# Altium footprint library IC.Pcblib: 91 footprints (part 3 of 6)
Each footprint in its own frame and in the unit in brackets; x right, y up, seen from the top. Pads: shape width x height; smd on the part's side, far side on the other; paste and mask are expansions set on the pad; w line width, h text height; cw(c..) or ccw(c..) is an arc to the next point about the centre after c.
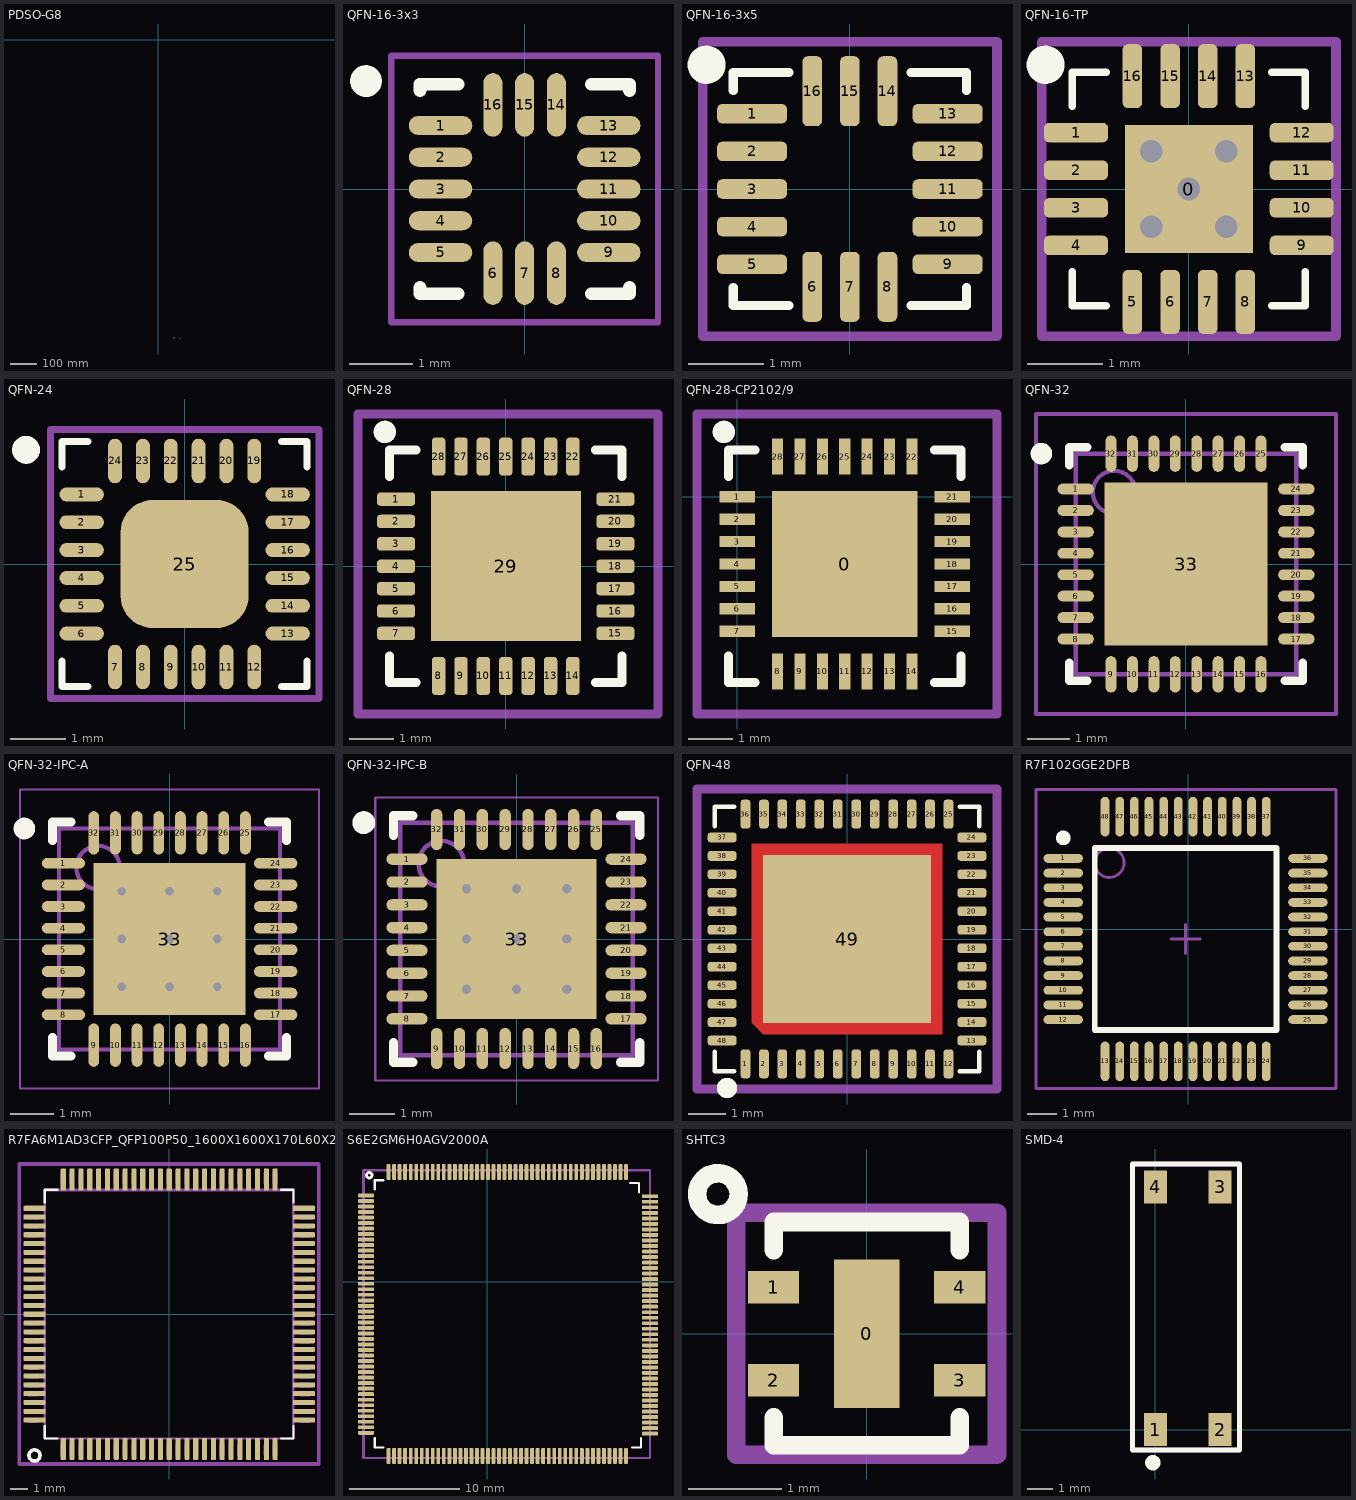
[diagram p2: the footprints below, top view; thin cyan lines are the x and y axes]

## PDSO-G8 [mm]
pads (11):
  round 1.524 hole 0.762: 1(59.2,-1117.9) 2(60.9,-1117.8)
  rect 0.5x2.2 smd: 3(0.6,1.55)
  rect 0.6x1.55 smd: 4(68.2,-1121.4) 4(68.2,-1118) 4(69.6,-1121.4) 4(69.6,-1118) 4(70.9,-1121.4) 4(70.9,-1118) 4(72.3,-1121.4) 4(72.3,-1118)
Top Layer:
  rectangle: 76.3,-1121.6 81.9,-1118.8
Mechanical 15:
  rectangle: -2.5,2.1 -2.3,2.4

## QFN-16-3x3 [mm] "QFN, 16-Leads, Body 3.00x3.00mm, Pitch 0.50mm, IPC Medium Density"
height 0.9
pads (16):
  oval 1x0.3 smd: 1(-1.325,1) 2(-1.325,0.5) 3(-1.325,0) 4(-1.325,-0.5) 5(-1.325,-1) 9(1.325,-1) 10(1.325,-0.5) 11(1.325,0) 12(1.325,0.5) 13(1.325,1)
  oval 0.3x1 smd: 6(-0.5,-1.325) 7(0,-1.325) 8(0.5,-1.325) 14(0.5,1.325) 15(0,1.325) 16(-0.5,1.325)
Top Overlay:
  circle w0.25: c-2.5,1.7 r0.125
  lines w0.2: -1.65,-1.55 -1.65,-1.65 -1.05,-1.65 ; -1.65,1.55 -1.65,1.65 -1.05,1.65 ; 1.05,-1.65 1.65,-1.65 1.65,-1.55 ; 1.05,1.65 1.65,1.65 1.65,1.55
Mechanical 13:
  lines w0.1: -2.1,-2.1 2.1,-2.1 2.1,2.1 -2.1,2.1 -2.1,-2.1
  text ".Designator" at -0.9,-0.2 h0.8
3D body "QFN50P300X300X90-16N.step": height 0.9, standoff 0, extent -1.55,-1.5 1.55,1.6

## QFN-16-3x5 [mm] "Quad Flat No-Lead (QFN), 0.50 mm pitch; square, 3 pin X 5 pin, 3.00 mm L X 3.00 mm W X 1.00 mm H body"
height 1
pads (16):
  rrect54% 0.93x0.26 smd: 1(-1.3,1) 2(-1.3,0.5) 3(-1.3,0) 4(-1.3,-0.5) 5(-1.3,-1) 9(1.3,-1) 10(1.3,-0.5) 11(1.3,0) 12(1.3,0.5) 13(1.3,1)
  rrect54% 0.26x0.93 smd: 6(-0.5,-1.3) 7(0,-1.3) 8(0.5,-1.3) 14(0.5,1.3) 15(0,1.3) 16(-0.5,1.3)
Top Overlay:
  circle w0.254: c-1.905,1.651 r0.127
  lines w0.12: -1.55,-1.31 -1.55,-1.55 -0.81,-1.55 ; -1.55,1.31 -1.55,1.55 -0.81,1.55 ; 0.81,-1.55 1.55,-1.55 1.55,-1.31 ; 0.81,1.55 1.55,1.55 1.55,1.31
Mechanical 13:
  lines w0.12: -1.956,-1.956 1.956,-1.956 1.956,1.956 -1.956,1.956 -1.956,-1.956
  text ".Designator" at -1.854,-0.229 h1
Mechanical 15:
  lines w0.127: -1.956,-1.956 -1.956,1.956 1.956,1.956 1.956,-1.956 -1.956,-1.956
  text ".Comment" at -1.854,-0.229 h1
3D body "QFN16P50_300X300X100L56X24.STEP": height 1, standoff 0, extent -1.55,-1.55 1.55,1.55

## QFN-16-TP [mm]
pads (17):
  rect 1.7x1.7 smd: 0(0,0)
  rrect54% 0.85x0.26 smd: 1(-1.5,0.75) 2(-1.5,0.25) 3(-1.5,-0.25) 4(-1.5,-0.75) 9(1.5,-0.75) 10(1.5,-0.25) 11(1.5,0.25) 12(1.5,0.75)
  rrect54% 0.26x0.85 smd: 5(-0.75,-1.5) 6(-0.25,-1.5) 7(0.25,-1.5) 8(0.75,-1.5) 13(0.75,1.5) 14(0.25,1.5) 15(-0.25,1.5) 16(-0.75,1.5)
via -0.5,0.5 diameter 0.6 hole 0.3
via -0.5,-0.5 diameter 0.6 hole 0.3
via 0.5,-0.5 diameter 0.6 hole 0.3
via 0.5,0.5 diameter 0.6 hole 0.3
via 0,0 diameter 0.6 hole 0.3
Top Overlay:
  circle w0.254: c-1.905,1.651 r0.127
  lines w0.1: -1.55,-1.1 -1.55,-1.55 -1.31,-1.55 -1.1,-1.55 ; -1.55,1.1 -1.55,1.31 -1.55,1.55 -1.1,1.55 ; 1.1,-1.55 1.55,-1.55 1.55,-1.31 1.55,-1.1 ; 1.1,1.55 1.31,1.55 1.55,1.55 1.55,1.1
Mechanical 13:
  lines w0.12: -1.956,-1.956 -1.956,1.956 1.956,1.956 1.956,-1.956 -1.956,-1.956
  text ".Designator" at -1.854,-0.229 h1
Mechanical 15:
  lines w0.127: -1.956,-1.956 1.956,-1.956 1.956,1.956 -1.956,1.956 -1.956,-1.956
  text ".Comment" at -1.854,-0.229 h1
3D body "ALSRobot-QFN16 3x3.STEP": height 0.9, standoff 0, extent -1.549,-1.521 1.493,1.521

## QFN-24 [mm]
height 1
pads (25):
  oval 0.8x0.25 smd: 1(-1.85,1.25) 2(-1.85,0.75) 3(-1.85,0.25) 4(-1.85,-0.25) 5(-1.85,-0.75) 6(-1.85,-1.25) 13(1.85,-1.25) 14(1.85,-0.75) 15(1.85,-0.25) 16(1.85,0.25) 17(1.85,0.75) 18(1.85,1.25)
  oval 0.25x0.8 smd: 7(-1.25,-1.85) 8(-0.75,-1.85) 9(-0.25,-1.85) 10(0.25,-1.85) 11(0.75,-1.85) 12(1.25,-1.85) 19(1.25,1.85) 20(0.75,1.85) 21(0.25,1.85) 22(-0.25,1.85) 23(-0.75,1.85) 24(-1.25,1.85)
  rrect50% 2.3x2.3 smd: 25(0,0)
Top Overlay:
  circle w0.25: c-2.85,2.05 r0.125
  lines w0.127: -2.2,-1.739 -2.2,-2.2 -1.738,-2.2 ; -2.2,1.738 -2.2,2.2 -1.738,2.2 ; 1.739,-2.2 2.2,-2.2 2.2,-1.739 ; 1.739,2.2 2.2,2.2 2.2,1.738
Mechanical 13:
  lines w0.127: -2.413,-2.413 2.413,-2.413 2.413,2.413 -2.413,2.413 -2.413,-2.413
  text ".Designator" at -2.2,-0.2 h1
Mechanical 15:
  lines w0.127: -2.413,-2.413 2.413,-2.413 2.413,2.413 -2.413,2.413 -2.413,-2.413
  text ".Comment" at -2.1,-0.2 h1
3D body: height 1, standoff 0, extent -2.05,-2.05 2.05,2.05

## QFN-28 [mm] "QFN, 28-Leads, Body 5.75x5.75mm, Pitch 0.65mm, Thermal Pad 3.70x3.70mm, IPC Medium Density"
height 0.8
pads (29):
  rrect50% 0.85x0.3 smd: 1(-2.45,1.5) 2(-2.45,1) 3(-2.45,0.5) 4(-2.45,0) 5(-2.45,-0.5) 6(-2.45,-1) 7(-2.45,-1.5) 15(2.45,-1.5) 16(2.45,-1) 17(2.45,-0.5) 18(2.45,0) 19(2.45,0.5) 20(2.45,1) 21(2.45,1.5)
  rrect50% 0.3x0.85 smd: 8(-1.5,-2.45) 9(-1,-2.45) 10(-0.5,-2.45) 11(0,-2.45) 12(0.5,-2.45) 13(1,-2.45) 14(1.5,-2.45) 22(1.5,2.45) 23(1,2.45) 24(0.5,2.45) 25(0,2.45) 26(-0.5,2.45) 27(-1,2.45) 28(-1.5,2.45)
  rect 3.35x3.35 smd: 29(0,0)
Top Overlay:
  circle w0.25: c-2.7,3 r0.125
  lines w0.2: -2.6,-2 -2.6,-2.6 -2,-2.6 ; -2.6,2 -2.6,2.6 -2,2.6 ; 2,-2.6 2.6,-2.6 2.6,-2 ; 2,2.6 2.6,2.6 2.6,2
Mechanical 13:
  lines w0.2: -3.3,-3.3 -3.3,3.4 3.4,3.4 3.4,-3.3 -3.3,-3.3
  text ".Designator" at -3,-0.4 h1.5
Mechanical 15:
  lines w0.2: -3.3,-3.3 3.4,-3.3 3.4,3.4 -3.3,3.4 -3.3,-3.3
  text ".Comment" at -3,-0.4 h1.5
3D body "User Library-QFN28_050.step": height 0.85, standoff 0, extent -2.505,-2.505 2.505,2.505

## QFN-28-CP2102/9 [mm]
height 1
pads (29):
  rect 3.25x3.25 smd: 0(2.4,-1.5)
  rect 0.8x0.25 smd: 1(0,0) 2(0,-0.5) 3(0,-1) 4(0,-1.5) 5(0,-2) 6(0,-2.5) 7(0,-3) 15(4.8,-3) 16(4.8,-2.5) 17(4.8,-2) 18(4.8,-1.5) 19(4.8,-1) 20(4.8,-0.5) 21(4.8,0)
  rect 0.25x0.8 smd: 8(0.9,-3.9) 9(1.4,-3.9) 10(1.9,-3.9) 11(2.4,-3.9) 12(2.9,-3.9) 13(3.4,-3.9) 14(3.9,-3.9) 22(3.9,0.9) 23(3.4,0.9) 24(2.9,0.9) 25(2.4,0.9) 26(1.9,0.9) 27(1.4,0.9) 28(0.9,0.9)
Top Overlay:
  circle w0.25: c-0.3,1.45 r0.125
  lines w0.2: -0.2,-3.55 -0.2,-4.15 0.4,-4.15 ; -0.2,0.45 -0.2,1.05 0.4,1.05 ; 4.4,-4.15 5,-4.15 5,-3.55 ; 4.4,1.05 5,1.05 5,0.45
Mechanical 13:
  lines w0.2: -0.9,-4.85 5.8,-4.85 5.8,1.85 -0.9,1.85 -0.9,-4.85
  text ".Designator" at -0.05,-1.15 h1
Mechanical 15:
  lines w0.2: -0.9,-4.85 -0.9,1.85 5.8,1.85 5.8,-4.85 -0.9,-4.85
  text ".Comment" at 0.05,-1.15 h1
3D body "User Library-QFN28_050.step": height 0.85, standoff 0, extent -0.105,-4.005 4.905,1.005

## QFN-32 [mm] "QFN, 32-Leads, Body 5x5 mm, Pitch 0.5mm, IPC High Density"
height 1
pads (33):
  oval 0.85x0.254 smd: 1(-2.575,1.75) 2(-2.575,1.25) 3(-2.575,0.75) 4(-2.575,0.25) 5(-2.575,-0.25) 6(-2.575,-0.75) 7(-2.575,-1.25) 8(-2.575,-1.75) 17(2.575,-1.75) 18(2.575,-1.25) 19(2.575,-0.75) 20(2.575,-0.25) 21(2.575,0.25) 22(2.575,0.75) 23(2.575,1.25) 24(2.575,1.75)
  oval 0.254x0.85 smd: 9(-1.75,-2.575) 10(-1.25,-2.575) 11(-0.75,-2.575) 12(-0.25,-2.575) 13(0.25,-2.575) 14(0.75,-2.575) 15(1.25,-2.575) 16(1.75,-2.575) 25(1.75,2.575) 26(1.25,2.575) 27(0.75,2.575) 28(0.25,2.575) 29(-0.25,2.575) 30(-0.75,2.575) 31(-1.25,2.575) 32(-1.75,2.575)
  rect 3.8x3.8 smd: 33(0,0)
Top Overlay:
  circle w0.25: c-3.375,2.575 r0.125
  lines w0.2: -2.725,-2.3 -2.725,-2.725 -2.3,-2.725 ; -2.725,2.3 -2.725,2.725 -2.3,2.725 ; 2.3,-2.725 2.725,-2.725 2.725,-2.3 ; 2.3,2.725 2.725,2.725 2.725,2.3
Mechanical 13:
  circle w0.1: c-1.675,1.675 r0.5
  lines w0.1: -2.575,-2.575 2.575,-2.575 2.575,2.575 -2.575,2.575 -2.575,-2.575
Mechanical 15:
  lines w0.1: -0.5,0 0.5,0 ; 0,-0.5 0,0.5 ; -3.5,-3.5 3.5,-3.5 3.5,3.5 -3.5,3.5 -3.5,-3.5
3D body "User Library-QFN32-1.STEP": height 0.9, standoff -0.03, extent -2.5,-2.5 2.5,2.5

## QFN-32-IPC-A [mm]
height 0.5
pads (33):
  oval 1x0.25 smd: 1(-2.45,1.75) 2(-2.45,1.25) 3(-2.45,0.75) 4(-2.45,0.25) 5(-2.45,-0.25) 6(-2.45,-0.75) 7(-2.45,-1.25) 8(-2.45,-1.75) 17(2.45,-1.75) 18(2.45,-1.25) 19(2.45,-0.75) 20(2.45,-0.25) 21(2.45,0.25) 22(2.45,0.75) 23(2.45,1.25) 24(2.45,1.75)
  oval 0.25x1 smd: 9(-1.75,-2.45) 10(-1.25,-2.45) 11(-0.75,-2.45) 12(-0.25,-2.45) 13(0.25,-2.45) 14(0.75,-2.45) 15(1.25,-2.45) 16(1.75,-2.45) 25(1.75,2.45) 26(1.25,2.45) 27(0.75,2.45) 28(0.25,2.45) 29(-0.25,2.45) 30(-0.75,2.45) 31(-1.25,2.45) 32(-1.75,2.45)
  rect 3.5x3.5 smd: 33(0,0)
via -1.1,1.1 diameter 0.5 hole 0.2
via 0,1.1 diameter 0.5 hole 0.2
via 1.1,1.1 diameter 0.5 hole 0.2
via -1.1,0 diameter 0.5 hole 0.2
via 0,0 diameter 0.5 hole 0.2
via 1.1,0 diameter 0.5 hole 0.2
via -1.1,-1.1 diameter 0.5 hole 0.2
via 0,-1.1 diameter 0.5 hole 0.2
via 1.1,-1.1 diameter 0.5 hole 0.2
Top Overlay:
  circle w0.25: c-3.35,2.55 r0.125
  lines w0.2: -2.7,-2.275 -2.7,-2.7 -2.275,-2.7 ; -2.7,2.275 -2.7,2.7 -2.275,2.7 ; 2.275,-2.7 2.7,-2.7 2.7,-2.275 ; 2.275,2.7 2.7,2.7 2.7,2.275
Mechanical 13:
  circle w0.1: c-1.65,1.65 r0.5
  lines w0.1: -2.55,-2.55 -2.55,2.55 2.55,2.55 2.55,-2.55 -2.55,-2.55
Mechanical 15:
  lines w0.05: -3.45,-3.45 -3.45,3.45 3.45,3.45 3.45,-3.45 -3.45,-3.45
  lines w0.1: -0.5,0 0.5,0 ; 0,-0.5 0,0.5
3D body "QFN-32-IPC-A.step": height 0.5, standoff 0, extent -2.57,-2.57 2.57,2.57

## QFN-32-IPC-B [mm] "QFN, 32-Leads, Body 5.00x5.00mm, Pitch 0.50mm, Thermal Pad 3.50x3.50mm, IPC Medium Density"
height 0.5
pads (33):
  oval 0.9x0.25 smd: 1(-2.4,1.75) 2(-2.4,1.25) 3(-2.4,0.75) 4(-2.4,0.25) 5(-2.4,-0.25) 6(-2.4,-0.75) 7(-2.4,-1.25) 8(-2.4,-1.75) 17(2.4,-1.75) 18(2.4,-1.25) 19(2.4,-0.75) 20(2.4,-0.25) 21(2.4,0.25) 22(2.4,0.75) 23(2.4,1.25) 24(2.4,1.75)
  oval 0.25x0.9 smd: 9(-1.75,-2.4) 10(-1.25,-2.4) 11(-0.75,-2.4) 12(-0.25,-2.4) 13(0.25,-2.4) 14(0.75,-2.4) 15(1.25,-2.4) 16(1.75,-2.4) 25(1.75,2.4) 26(1.25,2.4) 27(0.75,2.4) 28(0.25,2.4) 29(-0.25,2.4) 30(-0.75,2.4) 31(-1.25,2.4) 32(-1.75,2.4)
  rect 3.5x3.5 smd: 33(0,0)
via -1.1,1.1 diameter 0.5 hole 0.2
via 0,1.1 diameter 0.5 hole 0.2
via 1.1,1.1 diameter 0.5 hole 0.2
via -1.1,0 diameter 0.5 hole 0.2
via 0,0 diameter 0.5 hole 0.2
via 1.1,0 diameter 0.5 hole 0.2
via -1.1,-1.1 diameter 0.5 hole 0.2
via 0,-1.1 diameter 0.5 hole 0.2
via 1.1,-1.1 diameter 0.5 hole 0.2
Top Overlay:
  circle w0.25: c-3.35,2.55 r0.125
  lines w0.2: -2.7,-2.275 -2.7,-2.7 -2.275,-2.7 ; -2.7,2.275 -2.7,2.7 -2.275,2.7 ; 2.275,-2.7 2.7,-2.7 2.7,-2.275 ; 2.275,2.7 2.7,2.7 2.7,2.275
Mechanical 13:
  circle w0.1: c-1.65,1.65 r0.5
  lines w0.1: -2.55,-2.55 -2.55,2.55 2.55,2.55 2.55,-2.55 -2.55,-2.55
Mechanical 15:
  lines w0.05: -3.1,-3.1 -3.1,3.1 3.1,3.1 3.1,-3.1 -3.1,-3.1
  lines w0.1: -0.5,0 0.5,0 ; 0,-0.5 0,0.5
3D body "QFN-32-IPC.step": height 0.5, standoff 0, extent -2.57,-2.57 2.57,2.57

## QFN-48 [mm] "Quad Flat No-Lead (QFN with Tab), 0.50 mm pitch; square, 12 pin X 12 pin, 7.00 mm L X 7.00 mm W X 1.00 mm H body"
height 1
pads (49):
  rrect54% 0.26x0.78 smd: 1(-2.75,-3.385) 2(-2.25,-3.385) 3(-1.75,-3.385) 4(-1.25,-3.385) 5(-0.75,-3.385) 6(-0.25,-3.385) 7(0.25,-3.385) 8(0.75,-3.385) 9(1.25,-3.385) 10(1.75,-3.385) 11(2.25,-3.385) 12(2.75,-3.385) 25(2.75,3.385) 26(2.25,3.385) 27(1.75,3.385) 28(1.25,3.385) 29(0.75,3.385) 30(0.25,3.385) 31(-0.25,3.385) 32(-0.75,3.385) 33(-1.25,3.385) 34(-1.75,3.385) 35(-2.25,3.385) 36(-2.75,3.385)
  rrect54% 0.78x0.26 smd: 13(3.385,-2.75) 14(3.385,-2.25) 15(3.385,-1.75) 16(3.385,-1.25) 17(3.385,-0.75) 18(3.385,-0.25) 19(3.385,0.25) 20(3.385,0.75) 21(3.385,1.25) 22(3.385,1.75) 23(3.385,2.25) 24(3.385,2.75) 37(-3.385,2.75) 38(-3.385,2.25) 39(-3.385,1.75) 40(-3.385,1.25) 41(-3.385,0.75) 42(-3.385,0.25) 43(-3.385,-0.25) 44(-3.385,-0.75) 45(-3.385,-1.25) 46(-3.385,-1.75) 47(-3.385,-2.25) 48(-3.385,-2.75)
  rect 4.55x4.55 smd paste-4.55 mask-4.55: 49(0,0)
Top Layer:
  region: 2.575,-2.575 -2.275,-2.575 -2.575,-2.275 -2.575,2.575 2.575,2.575
Top Overlay:
  circle w0.5: c-3.251,-4.039 r0.025
  lines w0.12: -3.58,-3.06 -3.58,-3.58 -3.06,-3.58 ; -3.58,3.06 -3.58,3.58 -3.06,3.58 ; 3.06,-3.58 3.58,-3.58 3.58,-3.06 ; 3.06,3.58 3.58,3.58 3.58,3.06
Top Paste:
  region: 2.195,-2.195 0.375,-2.195 0.375,-0.375 2.195,-0.375
  region: 2.195,0.375 0.375,0.375 0.375,2.195 2.195,2.195
  region: -0.375,-2.195 -2.195,-2.195 -2.195,-0.375 -0.375,-0.375
  region: -0.375,0.375 -2.195,0.375 -2.195,2.195 -0.375,2.195
Top Solder:
  region: 2.575,-2.575 -2.275,-2.575 -2.575,-2.275 -2.575,2.575 2.575,2.575
Mechanical 13:
  lines w0.254: -4.064,-4.064 -4.064,4.064 4.064,4.064 4.064,-4.064 -4.064,-4.064
  text ".Designator" at -3.353,-0.533 h2
Mechanical 15:
  lines w0.254: -4.064,-4.064 -4.064,4.064 -3.632,4.064 4.064,4.064 4.064,-4.064 -4.064,-4.064
  text ".Comment" at -3.556,-0.533 h2
3D body "QFN49P50_700X700X100L40X24T515.STEP": height 1, standoff 0, extent -3.55,-3.55 3.55,3.55

## R7F102GGE2DFB [mm]
pads (48):
  oval 1.35x0.3 smd: 1(-4.257,2.416) 2(-4.257,1.916) 3(-4.257,1.416) 4(-4.257,0.916) 5(-4.257,0.416) 6(-4.257,-0.084) 7(-4.257,-0.584) 8(-4.257,-1.084) 9(-4.257,-1.584) 10(-4.257,-2.084) 11(-4.257,-2.584) 12(-4.257,-3.084) 25(4.093,-3.084) 26(4.093,-2.584) 27(4.093,-2.084) 28(4.093,-1.584) 29(4.093,-1.084) 30(4.093,-0.584) 31(4.093,-0.084) 32(4.093,0.416) 33(4.093,0.916) 34(4.093,1.416) 35(4.093,1.916) 36(4.093,2.416)
  oval 0.3x1.35 smd: 13(-2.832,-4.509) 14(-2.332,-4.509) 15(-1.832,-4.509) 16(-1.332,-4.509) 17(-0.832,-4.509) 18(-0.332,-4.509) 19(0.168,-4.509) 20(0.668,-4.509) 21(1.168,-4.509) 22(1.668,-4.509) 23(2.168,-4.509) 24(2.668,-4.509) 37(2.668,3.841) 38(2.168,3.841) 39(1.668,3.841) 40(1.168,3.841) 41(0.668,3.841) 42(0.168,3.841) 43(-0.332,3.841) 44(-0.832,3.841) 45(-1.332,3.841) 46(-1.832,3.841) 47(-2.332,3.841) 48(-2.832,3.841)
Top Overlay:
  circle w0.25: c-4.257,3.116 r0.125
  lines w0.2: -3.182,-3.434 -3.182,2.766 3.018,2.766 3.018,-3.434 -3.182,-3.434
Mechanical 13:
  circle w0.1: c-2.682,2.266 r0.5
  lines w0.1: -5.187,-5.439 -5.187,4.771 5.049,4.771 5.049,-5.439 -5.187,-5.439
  text ".Designator" at -2.114,-0.588 h1
Mechanical 15:
  lines w0.05: -5.182,-5.434 -5.182,4.766 5.018,4.766 5.018,-5.434 -5.182,-5.434
  lines w0.1: -0.582,-0.334 0.418,-0.334 ; -0.082,-0.834 -0.082,0.166
  text ".Comment" at -1.987,-0.588 h1
3D body "TSQFP50P890X890X160-48N.step": height 1.6, standoff 0, extent -4.532,-4.784 4.368,4.116

## R7FA6M1AD3CFP_QFP100P50_1600X1600X170L60X21NN [mm] "Quad Flat Pack (QFP), 0.50 mm pitch; square, 25 pin X 25 pin, 14.00 mm L X 14.00 mm W X 1.70 mm H body"
height 1.7
pads (100):
  rrect48% 0.29x1.26 smd: 1(-6,-7.63) 2(-5.5,-7.63) 3(-5,-7.63) 4(-4.5,-7.63) 5(-4,-7.63) 6(-3.5,-7.63) 7(-3,-7.63) 8(-2.5,-7.63) 9(-2,-7.63) 10(-1.5,-7.63) 11(-1,-7.63) 12(-0.5,-7.63) 13(0,-7.63) 14(0.5,-7.63) 15(1,-7.63) 16(1.5,-7.63) 17(2,-7.63) 18(2.5,-7.63) 19(3,-7.63) 20(3.5,-7.63) 21(4,-7.63) 22(4.5,-7.63) 23(5,-7.63) 24(5.5,-7.63) 25(6,-7.63) 51(6,7.63) 52(5.5,7.63) 53(5,7.63) 54(4.5,7.63) 55(4,7.63) 56(3.5,7.63) 57(3,7.63) 58(2.5,7.63) 59(2,7.63) 60(1.5,7.63) 61(1,7.63) 62(0.5,7.63) 63(0,7.63) 64(-0.5,7.63) 65(-1,7.63) 66(-1.5,7.63) 67(-2,7.63) 68(-2.5,7.63) 69(-3,7.63) 70(-3.5,7.63) 71(-4,7.63) 72(-4.5,7.63) 73(-5,7.63) 74(-5.5,7.63) 75(-6,7.63)
  rrect48% 1.26x0.29 smd: 26(7.63,-6) 27(7.63,-5.5) 28(7.63,-5) 29(7.63,-4.5) 30(7.63,-4) 31(7.63,-3.5) 32(7.63,-3) 33(7.63,-2.5) 34(7.63,-2) 35(7.63,-1.5) 36(7.63,-1) 37(7.63,-0.5) 38(7.63,0) 39(7.63,0.5) 40(7.63,1) 41(7.63,1.5) 42(7.63,2) 43(7.63,2.5) 44(7.63,3) 45(7.63,3.5) 46(7.63,4) 47(7.63,4.5) 48(7.63,5) 49(7.63,5.5) 50(7.63,6) 76(-7.63,6) 77(-7.63,5.5) 78(-7.63,5) 79(-7.63,4.5) 80(-7.63,4) 81(-7.63,3.5) 82(-7.63,3) 83(-7.63,2.5) 84(-7.63,2) 85(-7.63,1.5) 86(-7.63,1) 87(-7.63,0.5) 88(-7.63,0) 89(-7.63,-0.5) 90(-7.63,-1) 91(-7.63,-1.5) 92(-7.63,-2) 93(-7.63,-2.5) 94(-7.63,-3) 95(-7.63,-3.5) 96(-7.63,-4) 97(-7.63,-4.5) 98(-7.63,-5) 99(-7.63,-5.5) 100(-7.63,-6)
Top Overlay:
  circle w0.2: c-7.63,-8 r0.314
  lines w0.12: -7.05,-6.33 -7.05,-7.05 -6.33,-7.05 ; -7.05,6.33 -7.05,7.05 -6.33,7.05 ; 6.33,-7.05 7.05,-7.05 7.05,-6.33 ; 6.33,7.05 7.05,7.05 7.05,6.33
Mechanical 11:
  lines w0.12: -7.05,-7.05 -7.05,7.05 7.05,7.05 7.05,-7.05 -7.05,-7.05
Mechanical 12:
  drawing of 404 lines, arcs and shapes, not listed
Mechanical 13:
  lines w0.2: -8.484,-8.484 8.458,-8.484 8.458,8.509 -8.484,8.509 -8.484,-8.484
  text ".Designator" at -4.739,-0.566 h2
3D body "R7FA6M1AD3CFP_QFP100P50_1600X1600X170L60X21N.STEP": height 1.7, standoff 0, extent -8,-8 8,8

## S6E2GM6H0AGV2000A [mm]
pads (176):
  rrect50% 1.45x0.35 smd: 1(-10.972,7.825) 2(-10.972,7.325) 3(-10.972,6.825) 4(-10.972,6.325) 5(-10.972,5.825) 6(-10.972,5.325) 7(-10.972,4.825) 8(-10.972,4.325) 9(-10.972,3.825) 10(-10.972,3.325) 11(-10.972,2.825) 12(-10.972,2.325) 13(-10.972,1.825) 14(-10.972,1.325) 15(-10.972,0.825) 16(-10.972,0.325) 17(-10.972,-0.175) 18(-10.972,-0.675) 19(-10.972,-1.175) 20(-10.972,-1.675) 21(-10.972,-2.175) 22(-10.972,-2.675) 23(-10.972,-3.175) 24(-10.972,-3.675) 25(-10.972,-4.175) 26(-10.972,-4.675) 27(-10.972,-5.175) 28(-10.972,-5.675) 29(-10.972,-6.175) 30(-10.972,-6.675) 31(-10.972,-7.175) 32(-10.972,-7.675) 33(-10.972,-8.175) 34(-10.972,-8.675) 35(-10.972,-9.175) 36(-10.972,-9.675) 37(-10.972,-13.675) 38(-10.972,-13.175) 39(-10.972,-12.675) 40(-10.972,-12.175) 41(-10.972,-11.675) 42(-10.972,-11.175) 43(-10.972,-10.675) 44(-10.972,-10.175) 89(14.75,-13.75) 90(14.75,-13.25) 91(14.75,-12.75) 92(14.75,-12.25) 93(14.75,-11.75) 94(14.75,-11.25) 95(14.75,-10.75) 96(14.75,-10.25) 97(14.75,-9.75) 98(14.75,-9.25) 99(14.75,-8.75) 100(14.75,-8.25) 101(14.75,-7.75) 102(14.75,-7.25) 103(14.75,-6.75) 104(14.75,-6.25) 105(14.75,-5.75) 106(14.75,-5.25) 107(14.75,-4.75) 108(14.75,-4.251) 109(14.75,-3.75) 110(14.75,-3.25) 111(14.75,-2.75) 112(14.75,-2.25) 113(14.75,-1.75) 114(14.75,-1.25) 115(14.75,-0.75) 116(14.75,-0.25) 117(14.75,0.25) 118(14.75,0.75) 119(14.75,1.25) 120(14.75,1.75) 121(14.75,2.25) 122(14.75,2.75) 123(14.75,3.25) 124(14.75,3.75) 125(14.75,4.25) 126(14.75,4.75) 127(14.75,5.25) 128(14.75,5.75) 129(14.75,6.25) 130(14.75,6.75) 131(14.75,7.25) 132(14.75,7.75)
  rrect50% 0.35x1.45 smd: 45(-8.925,-15.773) 46(-8.425,-15.773) 47(-7.925,-15.773) 48(-7.425,-15.773) 49(-6.925,-15.773) 50(-6.425,-15.773) 51(-5.925,-15.773) 52(-5.425,-15.773) 53(-4.925,-15.773) 54(-4.425,-15.773) 55(-3.925,-15.773) 56(-3.425,-15.773) 57(-2.925,-15.773) 58(-2.425,-15.773) 59(-1.925,-15.773) 60(-1.425,-15.773) 61(-0.925,-15.773) 62(-0.425,-15.773) 63(0.075,-15.773) 64(0.575,-15.773) 65(1.075,-15.773) 66(1.575,-15.773) 67(2.075,-15.773) 68(2.575,-15.773) 69(3.075,-15.773) 70(3.575,-15.773) 71(4.075,-15.773) 72(4.575,-15.773) 73(5.075,-15.773) 74(5.575,-15.773) 75(6.075,-15.773) 76(6.575,-15.773) 77(7.075,-15.773) 78(7.575,-15.773) 79(8.075,-15.773) 80(8.575,-15.773) 81(9.075,-15.773) 82(9.575,-15.773) 83(10.075,-15.773) 84(10.575,-15.773) 85(11.075,-15.773) 86(11.575,-15.773) 87(12.075,-15.773) 88(12.575,-15.773) 133(12.575,9.947) 134(12.075,9.947) 135(11.575,9.947) 136(11.075,9.947) 137(10.575,9.947) 138(10.075,9.947) 139(9.575,9.947) 140(9.075,9.947) 141(8.575,9.947) 142(8.075,9.947) 143(7.575,9.947) 144(7.075,9.947) 145(6.575,9.947) 146(6.075,9.947) 147(5.575,9.947) 148(5.075,9.947) 149(4.575,9.947) 150(4.075,9.947) 151(3.575,9.947) 152(3.075,9.947) 153(2.575,9.947) 154(2.075,9.947) 155(1.575,9.947) 156(1.075,9.947) 157(0.575,9.947) 158(0.075,9.947) 159(-0.425,9.947) 160(-0.925,9.947) 161(-1.425,9.947) 162(-1.925,9.947) 163(-2.425,9.947) 164(-2.925,9.947) 165(-3.425,9.947) 166(-3.925,9.947) 167(-4.425,9.947) 168(-4.925,9.947) 169(-5.425,9.947) 170(-5.925,9.947) 171(-6.425,9.947) 172(-6.925,9.947) 173(-7.425,9.947) 174(-7.925,9.947) 175(-8.425,9.947) 176(-8.925,9.947)
Top Overlay:
  circle w0.254: c-10.676,9.656 r0.25
  lines w0.2: -10.176,-14.144 -10.176,-14.994 -9.376,-14.994 ; -10.176,8.356 -10.176,9.206 -9.376,9.206 ; 12.949,8.956 13.749,8.956 13.749,8.106 ; 13.124,-14.994 13.924,-14.994 13.924,-14.144
Mechanical 13:
  lines w0.2: -11.227,-15.952 14.75,-15.952 14.75,10.106 -11.227,10.106 -11.227,-15.952
  text ".Designator" at -8.676,3.956 h1.5
Mechanical 15:
  lines w0.2: -11.151,-15.952 -11.151,10.106 14.75,10.106 14.75,-15.952 -11.151,-15.952
  text ".Comment" at -8.726,4.256 h1.5
3D body "User Library-LQFP144-1.STEP": height 1.6, standoff 0, extent -9,-13.75 13,8.25

## SHTC3 [mm]
pads (5):
  rect 0.7x1.6 smd: 0(0,0)
  rect 0.55x0.35 smd: 1(-1,0.5) 2(-1,-0.5) 3(1,-0.5) 4(1,0.5)
Top Overlay:
  circle w0.2: c-1.6,1.5 r0.224
  lines w0.2: -1,-0.9 -1,-1.2 1,-1.2 1,-0.9 ; -1,0.9 -1,1.2 1,1.2 1,0.9
Mechanical 13:
  lines w0.2: -1.4,-1.3 1.4,-1.3 1.4,1.3 -1.4,1.3 -1.4,-1.3
  text ".Designator" at -1.4,-0.2 h1
Mechanical 15:
  lines w0.2: -1.4,-1.3 -1.4,1.3 1.4,1.3 1.4,-1.3 -1.4,-1.3
  text ".Comment" at -1.4,-0.2 h1
3D body "HT_CD_SHTC3_STEP_File_V1_D1.STEP": height 0.75, standoff 0, extent -1,-1 1,1

## SMD-4 [mm]
pads (4):
  rect 0.9x1.3 smd: 1(0,0) 2(2.54,0) 3(2.54,9.5) 4(0,9.5)
Top Overlay:
  circle w0.5: c-0.1,-1.3 r0.05
  lines w0.2: -0.9,-0.8 -0.9,10.4 3.3,10.4 3.3,-0.8 -0.9,-0.8
Mechanical 13:
  lines w0.2: -0.9,-0.8 3.3,-0.8 3.3,10.4 -0.9,10.4 -0.9,-0.8
  text ".Designator" at 1.454,1.757 h1
Mechanical 15:
  lines w0.2: -0.9,-0.8 3.3,-0.8 3.3,10.4 -0.9,10.4 -0.9,-0.8
  text ".Comment" at 1.454,1.884 h1
3D body "LSOP-4.STEP": height 2, standoff -0.14, extent -0.75,-0.3 3.35,9.9